# Altium footprint library 3D封装库.PcbLib: 716 footprints (part 45 of 45)
Each footprint in its own frame and in the unit in brackets; x right, y up, seen from the top. Pads: shape width x height; smd on the part's side, far side on the other; paste and mask are expansions set on the pad; w line width, h text height; cw(c..) or ccw(c..) is an arc to the next point about the centre after c.
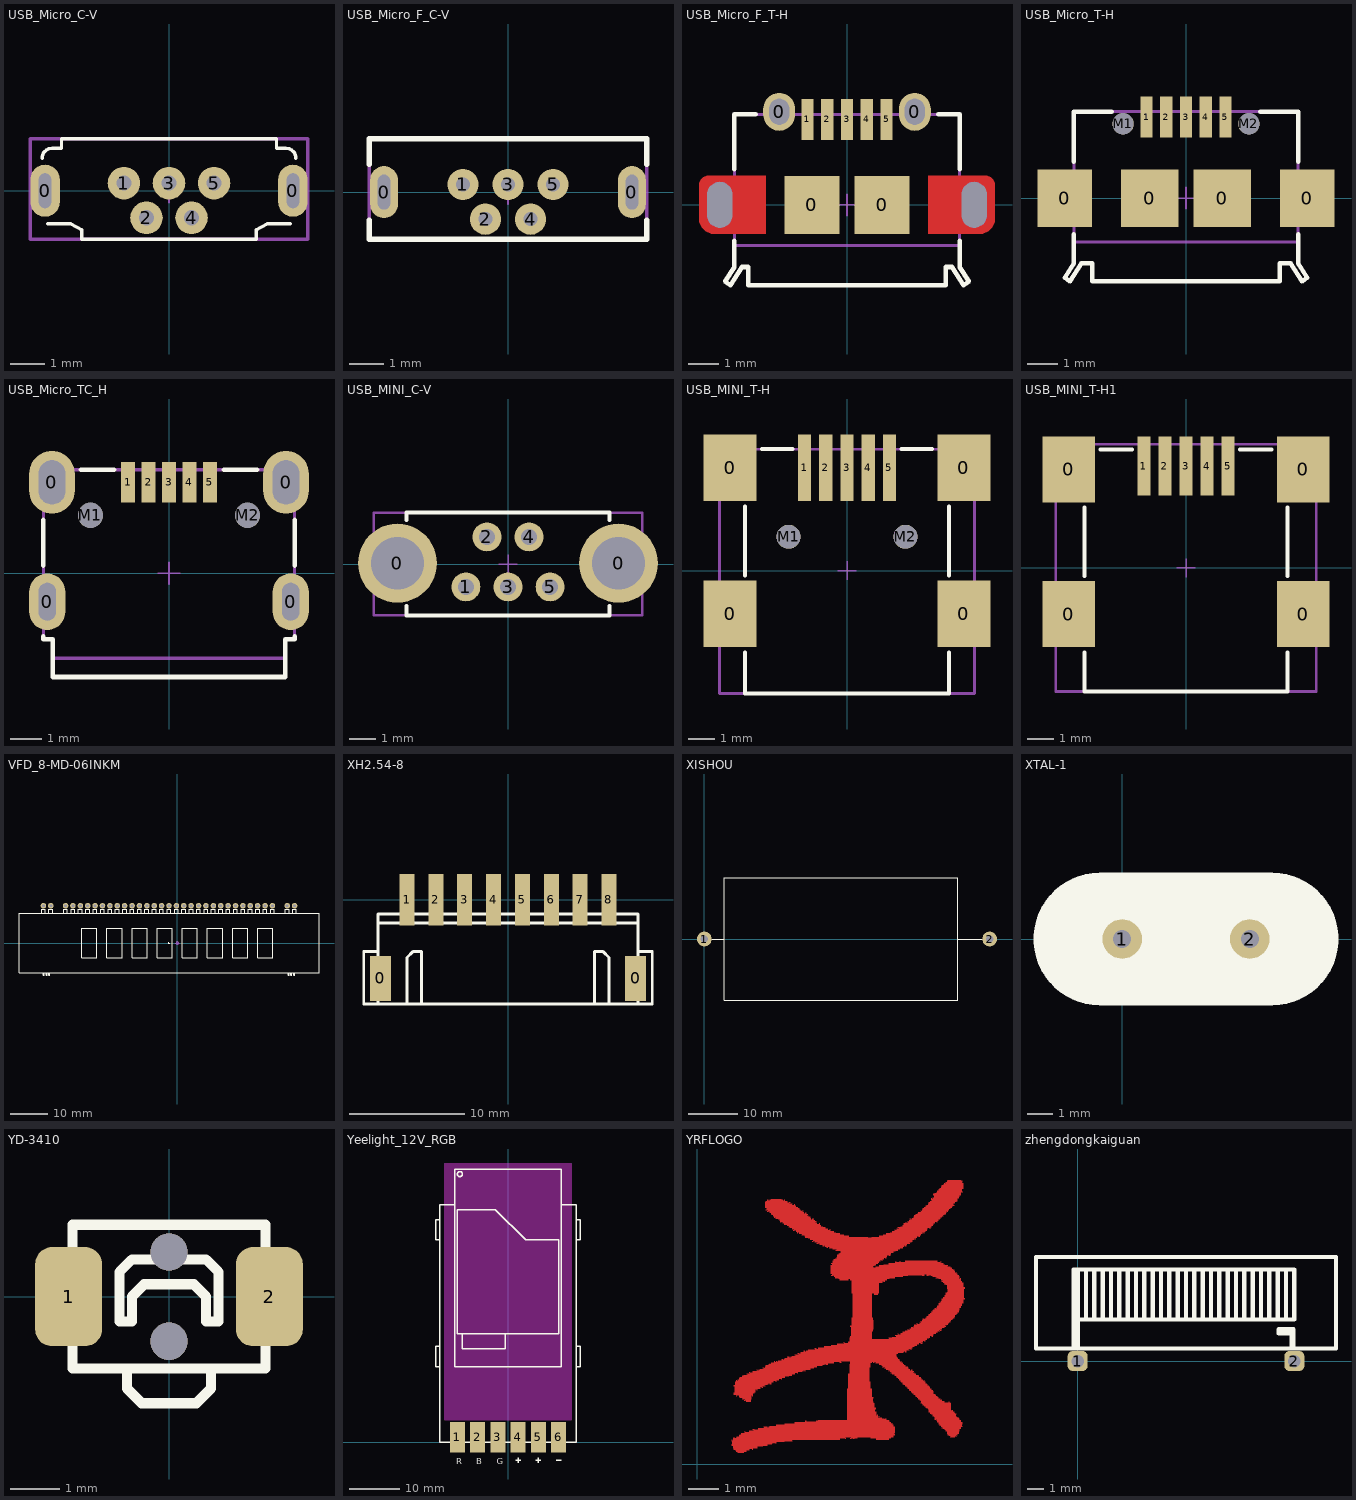
[diagram p44: the footprints below, top view; thin cyan lines are the x and y axes]

## USB_Micro_C-V [mm] "Micro USB 2.0 Type B Vertical 5 Contacts"
height 5.61
pads (7):
  oval 0.85x1.5 hole 0.35 slot 1 at 90 deg: 0(-3.575,0) 0(3.575,0)
  round 0.94 hole 0.44: 1(-1.3,0.22) 2(-0.65,-0.78) 3(0,0.22) 4(0.65,-0.78) 5(1.3,0.22)
Top Overlay:
  lines w0.1: -3.66,0.94 cw(c-3.38,0.94) -3.373,1.22 -3.1,1.22 -3.1,1.5 3.1,1.5 3.1,1.22 3.373,1.22 cw(c3.38,0.94) 3.66,0.94 ; -3.5,-0.953 -2.828,-0.953 -2.51,-1.13 -2.51,-1.4 2.51,-1.4 2.51,-1.13 2.828,-0.953 3.5,-0.953
Mechanical 1:
  text "PCB Thickness 1.0mm" at -3.5,-2.1 h0.76
Mechanical 13:
  lines w0.1: -4,-1.4 -4,1.5 4,1.5 4,-1.4 -4,-1.4
Mechanical 15:
  lines w0.05: -0.35,0 0.35,0 ; 0,-0.35 0,0.35
3D body "614105150721.stp": height 5.61, standoff -1.84, extent -4,-1.4 4,1.5

## USB_Micro_F_C-V [mm] "Micro USB 2.0 Type AB Vertical 5 Contacts"
height 5.61
pads (7):
  oval 0.8x1.5 hole 0.35 slot 1 at 90 deg: 0(-3.575,0) 0(3.575,0)
  round 0.9 hole 0.4: 1(-1.3,0.22) 2(-0.65,-0.78) 3(0,0.22) 4(0.65,-0.78) 5(1.3,0.22)
Top Overlay:
  lines w0.15: -4,-0.8 -4,-1.36 4,-1.36 4,-0.8 ; -4,0.8 -4,1.54 4,1.54 4,0.8
Mechanical 1:
  text "PCB Thickness 1.0mm" at -3.5,-2 h0.76
Mechanical 13:
  lines w0.1: -4,-1.36 -4,1.54 4,1.54 4,-1.36 -4,-1.36
Mechanical 15:
  lines w0.05: -0.35,0 0.35,0 ; 0,-0.35 0,0.35
3D body "614105150621.stp": height 5.66, standoff -1.45, extent -4,-1.36 4,1.54

## USB_Micro_F_T-H [mm] "Micro USB 2.0 Type AB Horizontal"
height 3
pads (11):
  round 0 / inner round 0 / far side oval 1.4x2.1 hole 0.825 slot 1.5 at 90 deg: 0(-4.175,0) 0(4.175,0)
  oval 1.05x1.25 hole 0.65 slot 0.85 at 90 deg: 0(-2.225,3.055) 0(2.225,3.055)
  rect 1.8x1.9 smd: 0(-1.15,0) 0(1.15,0)
  rect 0.4x1.35 smd: 1(-1.3,2.805) 2(-0.65,2.805) 3(0,2.805) 4(0.65,2.805) 5(1.3,2.805)
Top Layer:
  region: -4.353,-0.95 -4.452,-0.95 -4.636,-0.874 -4.776,-0.733 -4.852,-0.549 -4.852,-0.45 -4.852,0.65 -4.852,0.71 -4.807,0.82 -4.722,0.904 -4.612,0.95 -4.553,0.95 -2.668,0.95 -2.668,-0.95
  region: 4.353,-0.95 4.452,-0.95 4.636,-0.874 4.776,-0.733 4.852,-0.549 4.852,-0.45 4.852,0.65 4.852,0.71 4.807,0.82 4.722,0.904 4.612,0.95 4.553,0.95 2.668,0.95 2.668,-0.95
Top Overlay:
  lines w0.15: -3.7,-1.18 -3.7,-2.04 -4,-2.515 -3.825,-2.64 -3.45,-2.04 -3.24,-2.04 -3.24,-2.64 3.24,-2.64 3.24,-2.04 3.45,-2.04 3.825,-2.64 4,-2.515 3.7,-2.04 3.7,-1.18 ; -3.7,1.17 -3.7,2.97 -3,2.97 ; 3,2.97 3.7,2.97 3.7,1.17
Mechanical 1:
  lines w0.1: -3.7,-1.33 3.7,-1.33
  text "PCB Edge" at -1.5,-2.1 h0.76
  text "PCB Thickness 1.2mm" at -3.5,-3.4 h0.76
Mechanical 13:
  lines w0.1: -4,-2.515 -3.825,-2.64 -3.45,-2.04 -3.24,-2.04 -3.24,-2.64 3.24,-2.64 3.24,-2.04 3.45,-2.04 3.825,-2.64 4,-2.515 3.7,-2.04 3.7,2.97 -3.7,2.97 -3.7,-2.04 -4,-2.515
Mechanical 15:
  lines w0.05: -0.35,0 0.35,0 ; 0,-0.35 0,0.35
3D body "629105150921.stp": height 2.78, standoff -0.5, extent -4.3,-2.64 4.3,3.23

## USB_Micro_T-H [mm] "Micro USB 2.0 SMT Type B Horizontal 5 Contacts"
height 3
pads (11):
  rect 1.8x1.9 smd: 0(-4,0) 0(4,0)
  rect 1.9x1.9 smd: 0(-1.2,0) 0(1.2,0)
  rect 0.4x1.35 smd: 1(-1.3,2.675) 2(-0.65,2.675) 3(0,2.675) 4(0.65,2.675) 5(1.3,2.675)
  round 0.7 hole 0.7 unplated: M1(-2.075,2.45) M2(2.075,2.45)
Top Overlay:
  lines w0.15: -3.7,-1.2 -3.7,-2.15 -4,-2.625 -3.825,-2.75 -3.45,-2.15 -3.1,-2.15 -3.1,-2.75 3.1,-2.75 3.1,-2.15 3.45,-2.15 3.825,-2.75 4,-2.625 3.7,-2.15 3.7,-1.2 ; -3.7,1.2 -3.7,2.85 -2.45,2.85 ; 2.45,2.85 3.7,2.85 3.7,1.2
Mechanical 1:
  lines w0.1: -3.7,-1.45 3.7,-1.45
  text "PCB Edge" at -1.4,-2.1 h0.76
Mechanical 13:
  lines w0.1: -4,-2.625 -3.825,-2.75 -3.45,-2.15 -3.1,-2.15 -3.1,-2.75 3.1,-2.75 3.1,-2.15 3.45,-2.15 3.825,-2.75 4,-2.625 3.7,-2.15 3.7,2.85 -3.7,2.85 -3.7,-2.15 -4,-2.625
Mechanical 15:
  lines w0.05: -0.35,0 0.35,0 ; 0,-0.35 0,0.35
3D body "629105136821.stp": height 2.77, standoff -0.53, extent -4,-2.73 4,3.173

## USB_Micro_TC_H [mm] "Micro USB 2.0 SMT Type B Horizontal 5 Contacts High Current"
height 2.66
pads (11):
  oval 1.15x1.8 hole 0.55 slot 1.2 at 90 deg: 0(-3.875,-0.9) 0(3.875,-0.9)
  oval 1.45x2 hole 0.85 slot 1.4 at 90 deg: 0(-3.725,2.9) 0(3.725,2.9)
  rect 0.45x1.3 smd: 1(-1.3,2.9) 2(-0.65,2.9) 3(0,2.9) 4(0.65,2.9) 5(1.3,2.9)
  round 0.8 hole 0.8 unplated: M1(-2.5,1.85) M2(2.5,1.85)
Top Overlay:
  lines w0.15: -4,-2 -4,-2.1 -3.7,-2.1 -3.7,-3.3 3.7,-3.3 3.7,-2.1 4,-2.1 4,-2 ; -4,0.25 -4,1.7 ; -2.8,3.3 -1.75,3.3 ; 1.75,3.3 2.8,3.3 ; 4,0.25 4,1.7
Mechanical 1:
  lines w0.1: -3.7,-2.7 3.7,-2.7
  text "PCB Thickness 1.2mm" at -3.4,-4 h0.76
  text "PCB Edge" at -1.4,-2.5 h0.76
Mechanical 13:
  lines w0.1: -4,-2.1 -3.7,-2.1 -3.7,-3.3 3.7,-3.3 3.7,-2.1 4,-2.1 4,3.3 -4,3.3 -4,-2.1
Mechanical 15:
  lines w0.05: -0.35,0 0.35,0 ; 0,-0.35 0,0.35
3D body "629105150521.stp": height 2.77, standoff -1.75, extent -4,-3.3 4,3.303

## USB_MINI_C-V [mm] "Mini USB 2.0 Type B Vertical 5 Contacts"
height 9.2
pads (7):
  round 3 hole 2: 0(-4.2,0.03) 0(4.2,0.03)
  round 1.1 hole 0.6: 1(-1.6,-0.87) 2(-0.8,1.03) 3(0,-0.87) 4(0.8,1.03) 5(1.6,-0.87)
Top Overlay:
  lines w0.15: -3.85,-1.6 -3.85,-1.95 3.85,-1.95 3.85,-1.6 ; -3.85,1.67 -3.85,1.95 3.85,1.95 3.85,1.67
Mechanical 13:
  lines w0.1: -5.1,-1.95 5.1,-1.95 5.1,1.95 -5.1,1.95 -5.1,-1.95
Mechanical 15:
  lines w0.05: -0.35,0 0.35,0 ; 0,-0.35 0,0.35
3D body "651005136421.stp": height 9.45, standoff -2.55, extent -5.099,-1.92 5.098,1.98

## USB_MINI_T-H [mm] "Mini USB 2.0 Type B SMT Horizontal 5 Contacts"
height 3.9
pads (11):
  rect 2x2.5 smd: 0(-4.4,-1.625) 0(-4.4,3.875) 0(4.4,-1.625) 0(4.4,3.875)
  rect 0.5x2.5 smd: 1(-1.6,3.875) 2(-0.8,3.875) 3(0,3.875) 4(0.8,3.875) 5(1.6,3.875)
  round 0.9 hole 0.9 unplated: M1(-2.2,1.275) M2(2.2,1.275)
Top Overlay:
  lines w0.15: -3.85,-3.075 -3.85,-4.625 3.85,-4.625 3.85,-3.075 ; -3.85,-0.175 -3.85,2.425 ; -3.2,4.575 -2.05,4.575 ; 2.05,4.575 3.2,4.575 ; 3.85,-0.175 3.85,2.425
Mechanical 13:
  lines w0.1: -4.8,-4.625 -4.8,4.575 4.8,4.575 4.8,-4.625 -4.8,-4.625
Mechanical 15:
  lines w0.05: -0.35,0 0.35,0 ; 0,-0.35 0,0.35
3D body "65100516121.stp": height 3.92, standoff -0.98, extent -4.8,-4.625 4.8,4.625

## USB_MINI_T-H1 [mm] "Mini USB 2.0 Type AB SMT Horizontal 5 Contacts"
height 4
pads (9):
  rect 2x2.5 smd: 0(-4.45,-1.76) 0(-4.45,3.74) 0(4.45,-1.76) 0(4.45,3.74)
  rect 0.5x2.25 smd: 1(-1.6,3.865) 2(-0.8,3.865) 3(0,3.865) 4(0.8,3.865) 5(1.6,3.865)
Top Overlay:
  lines w0.15: -3.85,-3.21 -3.85,-4.7 3.85,-4.7 3.85,-3.21 ; -3.85,-0.31 -3.85,2.29 ; -3.25,4.5 -2.05,4.5 ; 2.05,4.5 3.25,4.5 ; 3.85,-0.31 3.85,2.29
Mechanical 13:
  lines w0.1: -4.95,-4.7 4.95,-4.7 4.95,4.7 -4.95,4.7 -4.95,-4.7
Mechanical 15:
  lines w0.05: -0.35,0 0.35,0 ; 0,-0.35 0,0.35
3D body "651305142821.stp": height 4.1, standoff 0, extent -4.95,-4.7 4.95,4.7

## VFD_8-MD-06INKM [mm]
pads (33):
  round 1.5 hole 0.8: 1(-36.25,10.1) 2(-34.25,10.1) 4(-30.25,10.1) 5(-28.25,10.1) 6(-26.25,10.1) 7(-24.25,10.1) 8(-22.25,10.1) 9(-20.25,10.1) 10(-18.25,10.1) 11(-16.25,10.1) 12(-14.25,10.1) 13(-12.25,10.1) 14(-10.25,10.1) 15(-8.25,10.1) 16(-6.25,10.1) 17(-4.25,10.1) 18(-2.25,10.1) 19(-0.25,10.1) 20(1.75,10.1) 21(3.75,10.1) 22(5.75,10.1) 23(7.75,10.1) 24(9.75,10.1) 25(11.75,10.1) 26(13.75,10.1) 27(15.75,10.1) 28(17.75,10.1) 29(19.75,10.1) 30(21.75,10.1) 31(23.75,10.1) 32(25.75,10.1) 34(29.75,10.1) 35(31.75,10.1)
Top Overlay:
  drawing of 155 lines, arcs and shapes, not listed
Mechanical 15:
  circle w0.05: c0,0 r0.35
  lines w0.05: -0.5,0 0.5,0 ; 0,-0.5 0,0.5
3D body "VFD屏.STEP": height 7, standoff -2.5, extent -42.85,-8.1 38.35,10.2

## XH2.54-8 [mm]
pads (10):
  rect 1.8x3.9 smd: 0(-11.05,-6.807) 0(11.05,-6.807)
  rect 1.3x4.5 smd: 1(-8.75,0) 2(-6.25,0) 3(-3.75,0) 4(-1.25,0) 5(1.25,0) 6(3.75,0) 7(6.25,0) 8(8.75,0)
Top Overlay:
  lines w0.254: -11.25,-4.5 -12.5,-4.5 -12.5,-9.05 -11.25,-9.05 ; -11.25,-2 11.25,-2 ; -8.75,-9.05 -8.75,-5 -8.25,-4.5 -7.5,-4.5 -7.5,-9.05 ; 7.5,-9.05 7.5,-4.5 8.25,-4.5 8.75,-5 8.75,-9.05 ; 11.25,-4.5 12.5,-4.5 12.5,-9.05 11.25,-9.05 ; -11.25,-9.05 11.25,-9.05 ; -11.25,-9.05 -11.25,-1.25 11.25,-1.25 11.25,-9.05

## XISHOU [mm]
pads (2):
  round 3 hole 1.5: 1(0,0) 2(58,0)
Top Overlay:
  lines w0.2: 1.5,0 4,0 ; 51.5,0 56.5,0 ; 4,-12.5 4,12.5 51.5,12.5 51.5,-12.5 4,-12.5

## XTAL-1 [mil]
pads (2):
  round 62 hole 28: 1(0,0) 2(200,0)
Top Overlay:
  lines w7.87: -35,-100 cw(c-35,0) -35,100 ; 235,-100 ccw(c235,0) 235,100
  lines w8: -35,-100 235,-100 ; -35,100 235,100
  lines w39.37: -35,-11.18 cw(c-35,0) -35,11.18 ; -35,40.31 ccw(c-35,0) -35,-40.31 235,-40.31 ccw(c235,0) 235,40.31 -25,40.31 ; 15,-10 190,-10 ; 15,15 190,15 195,10 ; 235,-11.18 ccw(c235,0) 235,11.18 ; -35,-77.62 cw(c-35,0) -35,77.62 235,77.62 cw(c235,0) 235,-77.62 -35,-77.62

## YD-3410 [mm] "贴片按键 侧"
pads (2):
  rrect50% 1.35x2 smd: 1(-2.025,0) 2(2.025,0)
via 0,-0.9 diameter 0.75 hole 0.75
via 0,0.9 diameter 0.75 hole 0.75
Top Overlay:
  lines w0.203: -0.85,-1.45 -0.85,-1.85 -0.55,-2.15 0.55,-2.15 0.85,-1.85 0.85,-1.45 ; -1.95,-1.45 -1.95,1.45 1.95,1.45 1.95,-1.45 -1.95,-1.45 ; -1,-0.5 -0.75,-0.5 -0.75,0 -0.5,0.25 0.5,0.25 0.75,0 0.75,-0.5 1,-0.5 1,0.5 0.75,0.75 -0.75,0.75 -1,0.5 -1,-0.5
3D body: height 1.5, standoff 0, extent -2,-1.5 2,1.5
3D body: height 1.2, standoff 0.3, extent -0.7,-2.1 0.7,-1.4

## Yeelight_12V_RGB [mm]
pads (6):
  rect 3x6 smd: 1(-10,1) 2(-6,1) 3(-2,1) 4(2,1) 5(6,1) 6(10,1)
Top Overlay:
  circle w0.254: c-9.5,53 r0.5
  lines w0.254: -13.5,15 -14.25,15 -14.25,19 -13.5,19 ; -13.5,40 -14.25,40 -14.25,44 -13.5,44 ; -10.5,47 -13.5,47 -13.5,0 13.5,0 13.5,47 10.5,47 ; -9,21.5 -9,18.5 -0.5,18.5 -0.5,21.5 ; 1.5,-3.5 2.5,-3.5 ; 2,-4 2,-3 ; 5.5,-3.5 6.5,-3.5 ; 6,-4 6,-3 ; 9.5,-3.5 10.5,-3.5 ; 13.5,15 14.25,15 14.25,19 13.5,19 ; 13.5,40 14.25,40 14.25,44 13.5,44 ; -10.5,15 -10.5,54 10.5,54 10.5,15 -10.5,15 ; -10,21.5 -10,46 -2.5,46 3.5,40 10,40 10,21.5 -10,21.5
  text "G" at -2.246,-4.246 h1.2
  text "B" at -6.246,-4.246 h1.2
  text "R" at -10.246,-4.246 h1.2
Keep-Out Layer:
  board cut-out: -12.5,4.5 -12.5,55 12.5,55 12.5,4.5
Keep-Out Layer:
  lines w0.254: -12.5,4.5 12.5,4.5 12.5,55 -12.5,55 -12.5,4.5

## YRFLOGO [mm]
Top Layer:
  lines w0.025: 1.151,0.626 2.345,0.626 ; 1.151,0.651 2.345,0.651 ; 1.151,0.778 3.107,0.778 ; 1.151,0.804 1.177,0.804 ; 1.177,0.677 2.497,0.677 ; 1.177,0.702 2.548,0.702 ; 1.177,0.727 2.65,0.727 ; 1.177,0.753 2.904,0.753 ; 1.202,0.55 2.015,0.55 ; 1.202,0.575 2.015,0.575 ; 1.202,0.6 2.193,0.6 ; 1.202,0.804 3.158,0.804 ; 1.202,0.829 4.758,0.829 ; 1.202,0.854 4.758,0.854 ; 1.202,0.88 1.253,0.88 ; 1.227,0.499 1.253,0.499 ; 1.227,0.524 1.862,0.524 ; 1.227,2.328 1.862,2.328 ; 1.227,2.353 1.862,2.353 ; 1.227,2.378 1.913,2.378 ; 1.227,2.607 2.269,2.607 ; 1.227,2.632 1.253,2.632 ; 1.253,2.404 1.939,2.404 ; 1.253,2.429 1.939,2.429 ; 1.253,2.455 1.939,2.455 ; 1.253,2.48 1.939,2.48 ; 1.253,2.505 2.015,2.505 ; 1.253,2.531 2.116,2.531 ; 1.253,2.556 2.091,2.556 ; 1.253,2.582 2.167,2.582 ; 1.278,0.473 1.735,0.473 ; 1.278,0.499 1.735,0.499 ; 1.278,2.632 2.243,2.632 ; 1.278,2.658 2.345,2.658 ; 1.278,2.683 2.37,2.683 ; 1.278,2.709 2.472,2.709 ; 1.278,2.734 2.548,2.734 ; 1.304,0.423 1.558,0.423 ; 1.304,0.448 1.634,0.448 ; 1.304,0.88 4.936,0.88 ; 1.304,2.277 1.329,2.277 ; 1.304,2.759 2.548,2.759 ; 1.304,2.785 1.329,2.785 ; 1.329,0.905 6.536,0.905 ; 1.329,2.302 1.862,2.302 ; 1.354,0.397 1.558,0.397 ; 1.354,2.785 2.65,2.785 ; 1.354,2.81 2.726,2.81 ; 1.405,0.931 6.536,0.931 ; 1.405,0.956 6.536,0.956 ; 1.405,2.251 1.812,2.251 ; 1.405,2.277 1.812,2.277 ; 1.405,2.836 2.726,2.836 ; 1.405,2.861 2.828,2.861 ; 1.431,0.981 6.536,0.981 ; 1.431,2.226 1.812,2.226 ; 1.431,2.886 2.929,2.886 ; 1.481,1.007 6.587,1.007 ; 1.481,1.032 6.561,1.032 ; 1.507,2.175 1.812,2.175 ; 1.507,2.912 2.929,2.912 ; 1.507,2.937 3.056,2.937 ; 1.532,2.201 1.812,2.201 ; 1.558,2.963 3.158,2.963 ; 1.583,0.423 1.634,0.423 ; 1.583,1.083 1.608,1.083 ; 1.583,2.124 1.608,2.124 ; 1.608,1.058 6.587,1.058 ; 1.608,2.15 1.786,2.15 ; 1.634,2.099 1.786,2.099 ; 1.634,2.124 1.786,2.124 ; 1.659,3.013 3.259,3.013 ; 1.685,2.988 3.158,2.988 ; 1.735,1.083 6.587,1.083 ; 1.735,1.108 6.587,1.108 ; 1.735,3.064 1.761,3.064 ; 1.761,3.039 3.259,3.039 ; 1.837,0.499 1.862,0.499 ; 1.837,2.277 1.862,2.277 ; 1.862,1.159 1.913,1.159 ; 1.862,3.064 3.361,3.064 ; 1.862,3.09 3.488,3.09 ; 1.888,1.134 6.587,1.134 ; 1.989,2.48 2.015,2.48 ; 1.989,3.14 2.015,3.14 ; 2.015,3.115 3.539,3.115 ; 2.04,1.159 6.587,1.159 ; 2.04,1.185 6.587,1.185 ; 2.066,3.14 3.615,3.14 ; 2.116,3.166 3.767,3.166 ; 2.167,2.556 2.193,2.556 ; 2.193,3.217 2.243,3.217 ; 2.218,1.235 2.269,1.235 ; 2.218,3.191 3.767,3.191 ; 2.243,1.21 6.587,1.21 ; 2.269,3.217 3.894,3.217 ; 2.269,3.242 3.996,3.242 ; 2.269,8.551 3.361,8.551 ; 2.269,8.576 3.285,8.576 ; 2.269,8.601 3.285,8.601 ; 2.269,8.627 3.259,8.627 ; 2.269,8.652 3.158,8.652 ; 2.269,8.678 3.183,8.678 ; 2.269,8.703 3.082,8.703 ; 2.269,8.728 3.005,8.728 ; 2.294,1.235 2.345,1.235 ; 2.294,3.267 3.996,3.267 ; 2.294,3.293 4.174,3.293 ; 2.294,8.474 2.32,8.474 ; 2.294,8.754 3.005,8.754 ; 2.32,8.5 3.412,8.5 ; 2.32,8.525 3.412,8.525 ; 2.345,8.424 2.37,8.424 ; 2.345,8.474 3.437,8.474 ; 2.345,8.779 2.929,8.779 ; 2.345,8.805 2.37,8.805 ; 2.37,8.449 3.463,8.449 ; 2.396,1.235 6.587,1.235 ; 2.396,3.318 4.25,3.318 ; 2.421,1.261 6.536,1.261 ; 2.421,2.683 2.472,2.683 ; 2.421,3.344 2.447,3.344 ; 2.421,8.398 3.564,8.398 ; 2.421,8.424 3.513,8.424 ; 2.421,8.805 2.853,8.805 ; 2.472,3.344 4.352,3.344 ; 2.472,3.369 4.555,3.369 ; 2.472,8.347 3.64,8.347 ; 2.472,8.373 3.564,8.373 ; 2.472,8.83 2.802,8.83 ; 2.497,8.322 3.691,8.322 ; 2.548,8.271 3.717,8.271 ; 2.548,8.297 3.666,8.297 ; 2.574,3.394 4.555,3.394 ; 2.574,3.42 2.599,3.42 ; 2.574,8.22 2.599,8.22 ; 2.574,8.246 3.767,8.246 ; 2.599,0.702 2.65,0.702 ; 2.624,2.759 2.65,2.759 ; 2.624,8.195 3.793,8.195 ; 2.624,8.22 3.767,8.22 ; 2.65,1.286 6.536,1.286 ; 2.65,1.312 6.536,1.312 ; 2.65,3.42 2.675,3.42 ; 2.701,3.42 4.783,3.42 ; 2.701,3.445 5.774,3.445 ; 2.701,8.17 3.793,8.17 ; 2.751,8.119 3.92,8.119 ; 2.751,8.144 3.869,8.144 ; 2.777,8.068 2.802,8.068 ; 2.777,8.093 3.92,8.093 ; 2.802,2.836 2.828,2.836 ; 2.828,3.471 6.739,3.471 ; 2.828,3.496 2.853,3.496 ; 2.853,8.043 3.996,8.043 ; 2.853,8.068 3.945,8.068 ; 2.904,3.496 6.688,3.496 ; 2.904,7.992 2.955,7.992 ; 2.904,8.017 3.996,8.017 ; 2.904,8.805 2.929,8.805 ; 2.929,1.337 6.511,1.337 ; 2.929,3.521 6.688,3.521 ; 2.98,7.992 4.098,7.992 ; 3.005,3.572 3.082,3.572 ; 3.005,7.966 4.123,7.966 ; 3.031,3.547 6.688,3.547 ; 3.056,7.916 4.199,7.916 ; 3.082,7.941 4.123,7.941 ; 3.082,8.728 3.107,8.728 ; 3.107,7.89 4.275,7.89 ; 3.132,0.778 3.183,0.778 ; 3.132,3.572 6.663,3.572 ; 3.183,3.598 6.638,3.598 ; 3.183,7.839 4.352,7.839 ; 3.183,7.865 4.275,7.865 ; 3.209,7.789 3.234,7.789 ; 3.234,7.814 4.352,7.814 ; 3.234,8.652 3.259,8.652 ; 3.259,1.362 6.46,1.362 ; 3.259,1.388 6.46,1.388 ; 3.259,3.648 6.638,3.648 ; 3.285,3.623 6.638,3.623 ; 3.31,7.763 4.555,7.763 ; 3.31,7.789 4.428,7.789 ; 3.336,3.039 3.361,3.039 ; 3.336,7.712 3.361,7.712 ; 3.336,7.738 4.555,7.738 ; 3.361,3.699 3.386,3.699 ; 3.386,3.674 6.638,3.674 ; 3.412,7.687 4.758,7.687 ; 3.412,7.712 4.631,7.712 ; 3.463,3.699 6.688,3.699 ; 3.463,3.725 6.866,3.725 ; 3.488,7.636 3.539,7.636 ; 3.488,8.449 3.539,8.449 ; 3.513,7.662 4.758,7.662 ; 3.564,3.75 6.892,3.75 ; 3.564,3.775 3.59,3.775 ; 3.564,7.636 4.885,7.636 ; 3.59,3.115 3.615,3.115 ; 3.59,7.611 5.063,7.611 ; 3.615,1.413 6.409,1.413 ; 3.615,1.439 3.64,1.439 ; 3.615,7.56 5.698,7.56 ; 3.615,7.585 5.063,7.585 ; 3.615,8.373 3.64,8.373 ; 3.64,3.775 6.968,3.775 ; 3.717,3.801 7.069,3.801 ; 3.717,7.535 7.273,7.535 ; 3.767,7.484 7.247,7.484 ; 3.767,7.509 7.247,7.509 ; 3.844,7.433 3.869,7.433 ; 3.844,8.17 3.894,8.17 ; 3.869,7.458 7.171,7.458 ; 3.92,3.852 3.971,3.852 ; 3.92,7.408 7.146,7.408 ; 3.92,7.433 7.171,7.433 ; 3.945,3.826 7.044,3.826 ; 3.945,8.093 3.971,8.093 ; 3.971,1.439 4.021,1.439 ; 3.996,7.357 4.047,7.357 ; 4.021,7.382 7.069,7.382 ; 4.047,1.439 6.409,1.439 ; 4.047,1.464 6.384,1.464 ; 4.047,3.852 7.146,3.852 ; 4.047,3.877 7.171,3.877 ; 4.072,8.017 4.098,8.017 ; 4.098,7.331 6.993,7.331 ; 4.098,7.357 7.019,7.357 ; 4.199,7.281 4.25,7.281 ; 4.199,7.306 6.968,7.306 ; 4.25,3.902 7.171,3.902 ; 4.25,3.928 7.247,3.928 ; 4.275,7.255 6.892,7.255 ; 4.275,7.281 6.892,7.281 ; 4.301,3.318 4.352,3.318 ; 4.326,7.23 4.352,7.23 ; 4.402,7.204 6.866,7.204 ; 4.402,7.814 4.453,7.814 ; 4.428,7.23 6.866,7.23 ; 4.453,6.366 8.644,6.366 ; 4.453,6.392 8.593,6.392 ; 4.453,6.417 8.593,6.417 ; 4.453,6.442 8.568,6.442 ; 4.453,6.468 8.517,6.468 ; 4.453,6.493 8.517,6.493 ; 4.453,6.519 8.492,6.519 ; 4.453,6.544 8.492,6.544 ; 4.453,6.569 5.876,6.569 ; 4.453,6.595 5.85,6.595 ; 4.453,6.62 5.901,6.62 ; 4.479,3.953 7.323,3.953 ; 4.479,6.29 4.529,6.29 ; 4.479,6.696 6.028,6.696 ; 4.504,6.315 7.577,6.315 ; 4.504,6.341 8.67,6.341 ; 4.504,6.646 5.952,6.646 ; 4.504,6.671 5.952,6.671 ; 4.529,6.722 6.053,6.722 ; 4.529,6.747 6.053,6.747 ; 4.529,6.773 6.104,6.773 ; 4.529,7.179 6.765,7.179 ; 4.555,6.29 7.019,6.29 ; 4.555,6.798 6.104,6.798 ; 4.555,6.823 6.18,6.823 ; 4.58,6.265 6.866,6.265 ; 4.606,6.214 6.587,6.214 ; 4.606,6.239 6.587,6.239 ; 4.606,6.849 6.231,6.849 ; 4.631,7.128 6.688,7.128 ; 4.656,6.874 6.231,6.874 ; 4.656,6.9 6.307,6.9 ; 4.656,7.154 6.688,7.154 ; 4.682,3.979 7.323,3.979 ; 4.682,4.004 7.4,4.004 ; 4.682,6.925 6.333,6.925 ; 4.682,6.95 6.333,6.95 ; 4.682,6.976 6.434,6.976 ; 4.733,6.188 6.409,6.188 ; 4.733,7.001 6.46,7.001 ; 4.758,3.394 4.809,3.394 ; 4.758,6.138 5.037,6.138 ; 4.758,6.163 5.037,6.163 ; 4.758,7.027 6.46,7.027 ; 4.783,7.052 6.536,7.052 ; 4.783,7.077 6.536,7.077 ; 4.783,7.103 6.612,7.103 ; 4.885,4.055 4.91,4.055 ; 4.91,4.029 7.4,4.029 ; 4.936,0.854 4.961,0.854 ; 5.012,1.489 6.307,1.489 ; 5.012,1.515 6.231,1.515 ; 5.012,1.54 6.155,1.54 ; 5.012,1.566 6.028,1.566 ; 5.012,1.591 6.028,1.591 ; 5.012,1.616 6.028,1.616 ; 5.012,1.642 5.977,1.642 ; 5.012,1.667 5.977,1.667 ; 5.012,1.693 5.977,1.693 ; 5.012,1.718 5.977,1.718 ; 5.012,1.743 5.977,1.743 ; 5.012,1.769 5.926,1.769 ; 5.012,1.794 5.926,1.794 ; 5.012,1.82 5.926,1.82 ; 5.012,1.845 5.952,1.845 ; 5.012,1.87 5.901,1.87 ; 5.012,1.896 5.901,1.896 ; 5.012,1.921 5.901,1.921 ; 5.012,1.947 5.901,1.947 ; 5.012,1.972 5.901,1.972 ; 5.012,1.997 5.901,1.997 ; 5.012,2.023 5.901,2.023 ; 5.012,2.048 5.876,2.048 ; 5.012,2.074 5.876,2.074 ; 5.012,2.099 5.85,2.099 ; 5.012,2.124 5.85,2.124 ; 5.012,2.15 5.85,2.15 ; 5.012,2.175 5.85,2.175 ; 5.012,2.201 5.876,2.201 ; 5.012,2.226 5.876,2.226 ; 5.012,2.251 5.825,2.251 ; 5.012,2.277 5.825,2.277 ; 5.012,2.302 5.825,2.302 ; 5.012,2.328 5.825,2.328 ; 5.012,2.353 5.825,2.353 ; 5.012,2.378 5.825,2.378 ; 5.012,2.404 5.825,2.404 ; 5.012,2.429 5.825,2.429 ; 5.012,2.455 5.825,2.455 ; 5.012,2.48 5.825,2.48 ; 5.012,2.505 5.825,2.505 ; 5.037,2.531 5.774,2.531 ; 5.037,2.556 5.774,2.556 ; 5.037,2.582 5.774,2.582 ; 5.037,2.607 5.774,2.607 ; 5.037,2.632 5.774,2.632 ; 5.037,2.658 5.774,2.658 ; 5.037,2.683 5.774,2.683 ; 5.037,2.709 5.774,2.709 ; 5.037,2.734 5.774,2.734 ; 5.037,2.759 5.749,2.759 ; 5.037,2.785 5.749,2.785 ; 5.037,2.81 5.749,2.81 ; 5.037,2.836 5.749,2.836 ; 5.037,2.861 5.749,2.861 ; 5.037,2.886 5.749,2.886 ; 5.037,2.912 5.749,2.912 ; 5.037,2.937 5.749,2.937 ; 5.037,2.963 5.749,2.963 ; 5.037,2.988 5.749,2.988 ; 5.037,3.013 5.749,3.013 ; 5.037,4.055 7.476,4.055 ; 5.037,4.08 7.527,4.08 ; 5.088,3.039 5.749,3.039 ; 5.088,3.064 5.749,3.064 ; 5.088,3.09 5.749,3.09 ; 5.088,3.115 5.749,3.115 ; 5.088,3.14 5.749,3.14 ; 5.088,3.166 5.749,3.166 ; 5.088,3.191 5.749,3.191 ; 5.088,3.217 5.749,3.217 ; 5.088,3.242 5.774,3.242 ; 5.088,3.267 5.774,3.267 ; 5.088,3.293 5.774,3.293 ; 5.088,3.318 5.774,3.318 ; 5.088,4.106 7.527,4.106 ; 5.088,4.131 7.603,4.131 ; 5.088,4.156 7.654,4.156 ; 5.088,4.182 5.825,4.182 ; 5.088,4.207 5.825,4.207 ; 5.114,0.854 5.139,0.854 ; 5.114,3.344 5.774,3.344 ; 5.114,3.369 5.774,3.369 ; 5.114,3.394 5.774,3.394 ; 5.114,3.42 5.774,3.42 ; 5.114,4.233 5.825,4.233 ; 5.114,4.258 5.825,4.258 ; 5.114,4.588 5.876,4.588 ; 5.114,4.614 5.139,4.614 ; 5.114,6.138 6.333,6.138 ; 5.114,6.163 6.333,6.163 ; 5.139,0.88 5.342,0.88 ; 5.139,4.283 5.825,4.283 ; 5.139,4.309 5.825,4.309 ; 5.139,4.334 5.825,4.334 ; 5.139,4.36 5.825,4.36 ; 5.139,4.385 5.825,4.385 ; 5.139,4.41 5.825,4.41 ; 5.139,4.436 5.85,4.436 ; 5.139,4.461 5.85,4.461 ; 5.139,4.487 5.85,4.487 ; 5.139,4.512 5.876,4.512 ; 5.139,4.537 5.876,4.537 ; 5.139,4.563 5.876,4.563 ; 5.164,4.614 5.876,4.614 ; 5.164,4.639 5.876,4.639 ; 5.164,4.664 5.876,4.664 ; 5.164,4.69 5.876,4.69 ; 5.164,4.715 5.876,4.715 ; 5.164,4.741 5.876,4.741 ; 5.164,4.766 5.876,4.766 ; 5.164,4.791 5.876,4.791 ; 5.164,4.817 5.85,4.817 ; 5.164,4.842 5.85,4.842 ; 5.164,4.868 5.85,4.868 ; 5.164,5.706 6.053,5.706 ; 5.164,5.731 6.053,5.731 ; 5.164,5.757 6.053,5.757 ; 5.164,5.782 6.053,5.782 ; 5.164,5.807 6.053,5.807 ; 5.164,5.833 6.053,5.833 ; 5.164,5.858 6.053,5.858 ; 5.164,5.884 6.053,5.884 ; 5.164,5.909 6.053,5.909 ; 5.164,5.934 6.053,5.934 ; 5.164,5.96 6.053,5.96 ; 5.164,5.985 6.053,5.985 ; 5.164,6.011 6.053,6.011 ; 5.164,6.036 6.053,6.036 ; 5.164,6.061 6.18,6.061 ; 5.164,6.087 6.18,6.087 ; 5.164,6.112 6.257,6.112 ; 5.19,4.893 5.825,4.893 ; 5.19,4.918 5.825,4.918 ; 5.19,4.944 5.825,4.944 ; 5.19,4.969 5.825,4.969 ; 5.19,4.995 5.825,4.995 ; 5.19,5.02 5.825,5.02 ; 5.19,5.045 5.825,5.045 ; 5.19,5.071 5.825,5.071 ; 5.19,5.096 5.825,5.096 ; 5.19,5.122 5.825,5.122 ; 5.19,5.147 5.825,5.147 ; 5.19,5.172 5.825,5.172 ; 5.19,5.198 5.825,5.198 ; 5.19,5.223 5.825,5.223 ; 5.19,5.249 5.825,5.249 ; 5.19,5.274 5.825,5.274 ; 5.19,5.299 5.825,5.299 ; 5.19,5.325 5.825,5.325 ; 5.19,5.35 5.825,5.35 ; 5.19,5.376 5.825,5.376 ; 5.19,5.401 5.825,5.401 ; 5.19,5.426 5.825,5.426 ; 5.19,5.452 5.825,5.452 ; 5.19,5.477 5.825,5.477 ; 5.19,5.503 5.825,5.503 ; 5.19,5.528 5.825,5.528 ; 5.19,5.553 5.825,5.553 ; 5.19,5.579 5.825,5.579 ; 5.19,5.604 5.825,5.604 ; 5.19,5.63 5.825,5.63 ; 5.19,5.655 5.774,5.655 ; 5.19,5.68 5.825,5.68 ; 5.215,0.854 5.241,0.854 ; 5.799,0.88 6.46,0.88 ; 5.799,3.394 5.825,3.394 ; 5.799,3.42 6.765,3.42 ; 5.799,3.445 6.765,3.445 ; 5.799,5.655 5.825,5.655 ; 5.825,7.56 7.323,7.56 ; 5.876,3.394 5.901,3.394 ; 5.901,5.655 5.952,5.655 ; 5.901,5.68 6.028,5.68 ; 5.926,1.87 5.952,1.87 ; 5.952,3.369 6.866,3.369 ; 5.952,3.394 6.815,3.394 ; 5.952,6.569 8.441,6.569 ; 5.977,0.829 6.384,0.829 ; 5.977,0.854 6.384,0.854 ; 5.977,5.655 6.028,5.655 ; 6.003,1.642 6.028,1.642 ; 6.053,1.591 6.079,1.591 ; 6.079,3.318 6.892,3.318 ; 6.079,3.344 6.866,3.344 ; 6.079,6.595 8.339,6.595 ; 6.079,6.62 8.365,6.62 ; 6.079,7.585 7.323,7.585 ; 6.079,7.611 7.425,7.611 ; 6.155,3.293 6.942,3.293 ; 6.155,6.798 6.18,6.798 ; 6.18,3.242 7.019,3.242 ; 6.206,3.267 6.942,3.267 ; 6.206,7.636 7.45,7.636 ; 6.231,6.087 6.257,6.087 ; 6.231,6.646 8.263,6.646 ; 6.257,1.515 6.307,1.515 ; 6.257,3.191 6.282,3.191 ; 6.282,3.217 7.044,3.217 ; 6.282,6.874 6.307,6.874 ; 6.307,3.166 7.095,3.166 ; 6.307,3.191 7.044,3.191 ; 6.307,7.662 7.45,7.662 ; 6.307,7.687 7.501,7.687 ; 6.384,3.115 6.409,3.115 ; 6.384,3.14 7.095,3.14 ; 6.384,4.207 6.434,4.207 ; 6.384,6.671 8.212,6.671 ; 6.384,6.696 8.212,6.696 ; 6.409,4.182 7.654,4.182 ; 6.409,6.95 6.434,6.95 ; 6.434,3.09 7.222,3.09 ; 6.434,3.115 7.171,3.115 ; 6.434,7.712 7.501,7.712 ; 6.46,3.039 7.247,3.039 ; 6.46,4.207 7.73,4.207 ; 6.485,1.362 6.511,1.362 ; 6.485,3.064 7.196,3.064 ; 6.511,3.013 7.298,3.013 ; 6.511,4.233 7.755,4.233 ; 6.511,7.738 7.577,7.738 ; 6.511,7.763 7.603,7.763 ; 6.561,0.981 6.587,0.981 ; 6.587,2.963 7.374,2.963 ; 6.587,2.988 7.298,2.988 ; 6.587,7.789 7.603,7.789 ; 6.587,7.814 6.612,7.814 ; 6.612,4.283 7.857,4.283 ; 6.612,6.722 8.111,6.722 ; 6.612,6.747 6.638,6.747 ; 6.638,2.937 7.4,2.937 ; 6.638,4.258 7.755,4.258 ; 6.663,2.886 7.45,2.886 ; 6.663,2.912 7.4,2.912 ; 6.663,7.814 7.654,7.814 ; 6.663,7.839 7.679,7.839 ; 6.688,4.334 6.714,4.334 ; 6.688,7.89 7.781,7.89 ; 6.714,2.861 7.476,2.861 ; 6.714,3.496 6.739,3.496 ; 6.714,4.309 7.882,4.309 ; 6.739,2.81 7.527,2.81 ; 6.739,2.836 7.476,2.836 ; 6.739,6.747 6.79,6.747 ; 6.739,7.865 7.679,7.865 ; 6.79,2.759 7.577,2.759 ; 6.79,2.785 7.527,2.785 ; 6.79,3.42 6.815,3.42 ; 6.79,4.334 7.882,4.334 ; 6.79,4.36 7.958,4.36 ; 6.79,7.916 7.806,7.916 ; 6.815,2.734 7.603,2.734 ; 6.866,2.683 7.654,2.683 ; 6.866,2.709 7.603,2.709 ; 6.866,4.385 7.958,4.385 ; 6.866,4.41 8.009,4.41 ; 6.866,7.941 7.806,7.941 ; 6.866,7.966 7.857,7.966 ; 6.892,2.658 7.679,2.658 ; 6.892,7.992 7.882,7.992 ; 6.892,8.017 6.917,8.017 ; 6.917,7.281 6.968,7.281 ; 6.942,2.607 6.968,2.607 ; 6.942,2.632 7.679,2.632 ; 6.942,3.75 6.968,3.75 ; 6.942,4.436 8.085,4.436 ; 6.942,6.747 8.009,6.747 ; 6.942,6.773 8.009,6.773 ; 6.942,8.017 7.882,8.017 ; 6.942,8.043 7.933,8.043 ; 6.993,2.582 7.755,2.582 ; 6.993,2.607 7.73,2.607 ; 7.019,2.531 7.755,2.531 ; 7.019,2.556 7.755,2.556 ; 7.019,4.461 8.06,4.461 ; 7.019,4.487 7.044,4.487 ; 7.019,8.093 7.044,8.093 ; 7.044,7.357 7.095,7.357 ; 7.044,8.068 7.933,8.068 ; 7.069,2.48 7.806,2.48 ; 7.069,2.505 7.806,2.505 ; 7.069,8.093 8.009,8.093 ; 7.069,8.119 8.035,8.119 ; 7.095,2.455 7.857,2.455 ; 7.095,4.487 8.111,4.487 ; 7.095,4.512 8.162,4.512 ; 7.095,8.17 7.146,8.17 ; 7.12,3.826 7.146,3.826 ; 7.12,8.144 8.035,8.144 ; 7.146,2.404 7.882,2.404 ; 7.146,2.429 7.882,2.429 ; 7.146,3.14 7.171,3.14 ; 7.146,4.537 8.162,4.537 ; 7.146,4.563 7.196,4.563 ; 7.171,2.378 7.882,2.378 ; 7.171,8.17 8.085,8.17 ; 7.171,8.195 8.111,8.195 ; 7.222,2.328 7.933,2.328 ; 7.222,2.353 7.882,2.353 ; 7.222,4.563 8.238,4.563 ; 7.222,4.588 8.289,4.588 ; 7.222,8.22 8.111,8.22 ; 7.222,8.246 8.162,8.246 ; 7.247,4.614 8.263,4.614 ; 7.247,4.639 8.314,4.639 ; 7.247,8.271 8.212,8.271 ; 7.247,8.297 7.273,8.297 ; 7.273,2.302 7.958,2.302 ; 7.273,7.509 7.298,7.509 ; 7.298,2.251 8.009,2.251 ; 7.298,2.277 7.958,2.277 ; 7.298,8.297 8.187,8.297 ; 7.298,8.322 8.238,8.322 ; 7.323,4.69 7.349,4.69 ; 7.349,2.226 8.035,2.226 ; 7.349,4.664 8.365,4.664 ; 7.349,8.347 8.238,8.347 ; 7.374,2.175 8.111,2.175 ; 7.374,2.201 8.035,2.201 ; 7.374,8.373 8.289,8.373 ; 7.374,8.398 8.314,8.398 ; 7.4,7.585 7.425,7.585 ; 7.425,2.15 8.111,2.15 ; 7.425,4.69 8.365,4.69 ; 7.425,4.715 8.39,4.715 ; 7.45,2.048 8.441,2.048 ; 7.45,2.124 8.162,2.124 ; 7.45,4.029 7.501,4.029 ; 7.45,4.766 7.476,4.766 ; 7.45,8.449 7.476,8.449 ; 7.476,2.074 8.238,2.074 ; 7.476,2.099 8.238,2.099 ; 7.476,4.741 8.39,4.741 ; 7.476,8.424 8.314,8.424 ; 7.501,2.023 8.466,2.023 ; 7.501,4.766 8.441,4.766 ; 7.501,4.791 8.466,4.791 ; 7.501,6.29 7.577,6.29 ; 7.501,8.449 8.365,8.449 ; 7.501,8.474 8.39,8.474 ; 7.527,1.972 7.552,1.972 ; 7.527,1.997 8.466,1.997 ; 7.527,4.817 8.492,4.817 ; 7.527,4.842 7.577,4.842 ; 7.527,8.5 8.39,8.5 ; 7.527,8.525 8.441,8.525 ; 7.552,2.785 7.577,2.785 ; 7.552,7.712 7.577,7.712 ; 7.577,1.947 8.466,1.947 ; 7.577,1.972 8.466,1.972 ; 7.577,4.106 7.603,4.106 ; 7.577,8.551 8.492,8.551 ; 7.603,4.842 8.517,4.842 ; 7.628,1.896 8.466,1.896 ; 7.628,1.921 8.466,1.921 ; 7.628,4.868 8.568,4.868 ; 7.628,7.789 7.654,7.789 ; 7.628,8.576 8.492,8.576 ; 7.628,8.601 8.517,8.601 ; 7.654,1.87 8.466,1.87 ; 7.654,4.893 8.568,4.893 ; 7.654,4.918 8.593,4.918 ; 7.654,6.29 7.704,6.29 ; 7.654,6.315 8.67,6.315 ; 7.654,8.627 8.568,8.627 ; 7.704,1.845 8.466,1.845 ; 7.704,4.944 8.593,4.944 ; 7.704,8.652 8.543,8.652 ; 7.704,8.678 8.543,8.678 ; 7.73,1.743 8.568,1.743 ; 7.73,1.769 8.517,1.769 ; 7.73,1.794 8.466,1.794 ; 7.73,1.82 8.466,1.82 ; 7.73,4.969 8.593,4.969 ; 7.73,4.995 8.644,4.995 ; 7.73,8.703 8.593,8.703 ; 7.73,8.728 7.755,8.728 ; 7.755,7.865 7.781,7.865 ; 7.781,1.693 8.593,1.693 ; 7.781,1.718 8.568,1.718 ; 7.781,5.02 8.67,5.02 ; 7.781,8.728 8.593,8.728 ; 7.781,8.754 8.644,8.754 ; 7.806,1.667 8.644,1.667 ; 7.806,5.071 8.72,5.071 ; 7.806,6.29 8.72,6.29 ; 7.806,8.83 8.67,8.83 ; 7.806,8.855 7.831,8.855 ; 7.831,4.258 7.857,4.258 ; 7.831,5.045 8.67,5.045 ; 7.831,8.779 8.67,8.779 ; 7.831,8.805 8.67,8.805 ; 7.857,1.616 8.619,1.616 ; 7.857,1.642 8.619,1.642 ; 7.857,5.096 8.72,5.096 ; 7.857,5.122 8.72,5.122 ; 7.857,6.265 8.746,6.265 ; 7.857,8.855 8.67,8.855 ; 7.857,8.881 8.72,8.881 ; 7.882,5.147 8.746,5.147 ; 7.882,8.982 8.797,8.982 ; 7.882,9.008 7.908,9.008 ; 7.908,1.591 8.644,1.591 ; 7.908,8.906 8.72,8.906 ; 7.908,8.932 8.746,8.932 ; 7.908,8.957 8.746,8.957 ; 7.933,1.489 7.958,1.489 ; 7.933,1.515 8.746,1.515 ; 7.933,1.54 8.72,1.54 ; 7.933,1.566 8.67,1.566 ; 7.933,5.172 8.746,5.172 ; 7.933,5.198 7.958,5.198 ; 7.933,9.008 8.797,9.008 ; 7.933,9.033 8.797,9.033 ; 7.958,6.214 8.746,6.214 ; 7.984,1.464 8.797,1.464 ; 7.984,1.489 8.746,1.489 ; 7.984,4.385 8.009,4.385 ; 7.984,5.198 8.746,5.198 ; 7.984,5.223 8.797,5.223 ; 7.984,6.239 8.746,6.239 ; 7.984,8.068 8.009,8.068 ; 7.984,9.059 8.797,9.059 ; 8.009,1.413 8.035,1.413 ; 8.009,1.439 8.797,1.439 ; 8.009,5.249 8.797,5.249 ; 8.009,5.274 8.797,5.274 ; 8.009,9.084 8.847,9.084 ; 8.009,9.109 8.822,9.109 ; 8.06,1.337 8.847,1.337 ; 8.06,1.362 8.847,1.362 ; 8.06,1.388 8.847,1.388 ; 8.06,1.413 8.797,1.413 ; 8.06,5.299 8.822,5.299 ; 8.06,5.325 8.822,5.325 ; 8.06,5.35 8.822,5.35 ; 8.06,6.188 8.746,6.188 ; 8.06,9.135 8.822,9.135 ; 8.06,9.16 8.822,9.16 ; 8.085,1.286 8.111,1.286 ; 8.085,1.312 8.822,1.312 ; 8.085,5.401 8.111,5.401 ; 8.085,9.186 8.873,9.186 ; 8.111,4.461 8.136,4.461 ; 8.111,5.376 8.873,5.376 ; 8.111,6.747 8.136,6.747 ; 8.136,1.261 8.847,1.261 ; 8.136,1.286 8.822,1.286 ; 8.136,2.15 8.162,2.15 ; 8.136,5.401 8.873,5.401 ; 8.136,5.426 8.873,5.426 ; 8.136,6.138 8.797,6.138 ; 8.136,6.163 8.797,6.163 ; 8.136,9.211 8.873,9.211 ; 8.136,9.236 8.873,9.236 ; 8.162,1.21 8.187,1.21 ; 8.162,5.452 8.873,5.452 ; 8.162,5.477 8.873,5.477 ; 8.162,5.503 8.924,5.503 ; 8.162,6.087 8.187,6.087 ; 8.162,9.262 8.873,9.262 ; 8.162,9.287 8.187,9.287 ; 8.187,1.235 8.797,1.235 ; 8.187,6.112 8.797,6.112 ; 8.212,1.185 8.797,1.185 ; 8.212,1.21 8.797,1.21 ; 8.212,5.528 8.924,5.528 ; 8.212,5.553 8.898,5.553 ; 8.212,6.061 8.238,6.061 ; 8.212,6.087 8.822,6.087 ; 8.212,9.287 8.873,9.287 ; 8.212,9.313 8.873,9.313 ; 8.238,6.011 8.873,6.011 ; 8.238,9.338 8.873,9.338 ; 8.238,9.363 8.263,9.363 ; 8.263,1.159 8.746,1.159 ; 8.263,5.579 8.898,5.579 ; 8.263,5.604 8.898,5.604 ; 8.263,5.63 8.898,5.63 ; 8.263,6.036 8.873,6.036 ; 8.263,6.061 8.822,6.061 ; 8.263,8.347 8.289,8.347 ; 8.289,1.108 8.746,1.108 ; 8.289,1.134 8.746,1.134 ; 8.289,5.655 8.898,5.655 ; 8.289,5.68 8.898,5.68 ; 8.289,5.706 8.898,5.706 ; 8.289,5.985 8.873,5.985 ; 8.289,9.363 8.822,9.363 ; 8.289,9.389 8.822,9.389 ; 8.339,1.032 8.72,1.032 ; 8.339,1.058 8.72,1.058 ; 8.339,1.083 8.72,1.083 ; 8.339,5.731 8.898,5.731 ; 8.339,5.858 8.924,5.858 ; 8.339,5.884 8.873,5.884 ; 8.339,5.909 8.873,5.909 ; 8.339,5.934 8.873,5.934 ; 8.339,5.96 8.873,5.96 ; 8.339,8.424 8.365,8.424 ; 8.339,9.414 8.847,9.414 ; 8.339,9.44 8.847,9.44 ; 8.365,0.981 8.67,0.981 ; 8.365,1.007 8.67,1.007 ; 8.365,5.757 8.898,5.757 ; 8.365,5.782 8.898,5.782 ; 8.365,5.807 8.898,5.807 ; 8.365,5.833 8.898,5.833 ; 8.365,9.465 8.797,9.465 ; 8.39,2.074 8.416,2.074 ; 8.416,0.956 8.619,0.956 ; 8.416,4.741 8.441,4.741 ; 8.441,0.905 8.593,0.905 ; 8.466,0.931 8.593,0.931 ; 8.492,1.794 8.517,1.794 ; 8.543,6.468 8.568,6.468 ; 8.619,0.931 8.644,0.931 ; 8.619,6.392 8.644,6.392 ; 8.771,6.188 8.797,6.188 ; 8.822,9.059 8.847,9.059 ; 8.847,9.363 8.873,9.363 ; 8.898,5.884 8.924,5.884
Top Solder:
  rectangle: 0,0 10,10
Bottom Solder:
  rectangle: 0,0 10,10

## zhengdongkaiguan [mm]
pads (2):
  rrect50% 1.2x1.2 hole 0.75: 1(0,0) 2(13,0)
Top Overlay:
  lines w0.254: -0.25,0.75 -0.25,5.5 ; 0,0.75 0,2.5 0,5.5 ; 0.5,2.5 0.5,5.5 ; 1,2.5 1,5.5 ; 1.5,2.5 1.5,5.5 ; 2,2.5 2,5.5 ; 2.5,2.5 2.5,5.5 ; 3,2.5 3,5.5 ; 3.5,2.5 3.5,5.5 ; 4,2.5 4,5.5 ; 4.5,2.5 4.5,2.75 4.5,5.5 ; 5,2.5 5,5.5 ; 5.5,2.5 5.5,5.5 ; 6,2.5 6,5.5 ; 6.5,2.5 6.5,5.5 ; 7,2.5 7,5.5 ; 7.5,2.5 7.5,5.5 ; 8,2.5 8,5.5 ; 8.5,2.5 8.5,5.5 ; 9,2.5 9,5.5 ; 9.5,2.5 9.5,5.5 ; 10,2.5 10,5.5 ; 10.5,2.5 10.5,5.5 ; 11,2.5 11,5.5 ; 11.5,2.5 11.5,5.5 ; 12,2.5 12,5.5 ; 12.5,2.5 12.5,5.5 ; 12.827,0.889 12.827,1.651 12.065,1.651 12.065,1.905 12.954,1.905 12.954,0.75 ; -0.25,5.5 13,5.5 13,2.5 -0.25,2.5 -0.25,5.5 ; -2.5,0.75 15.5,0.75 15.5,6.25 -2.5,6.25 -2.5,0.75